# Altium footprint library MyComponents_v2.5.PcbLib: 403 footprints (part 3 of 26)
Each footprint in its own frame and in the unit in brackets; x right, y up, seen from the top. Pads: shape width x height; smd on the part's side, far side on the other; paste and mask are expansions set on the pad; w line width, h text height; cw(c..) or ccw(c..) is an arc to the next point about the centre after c.
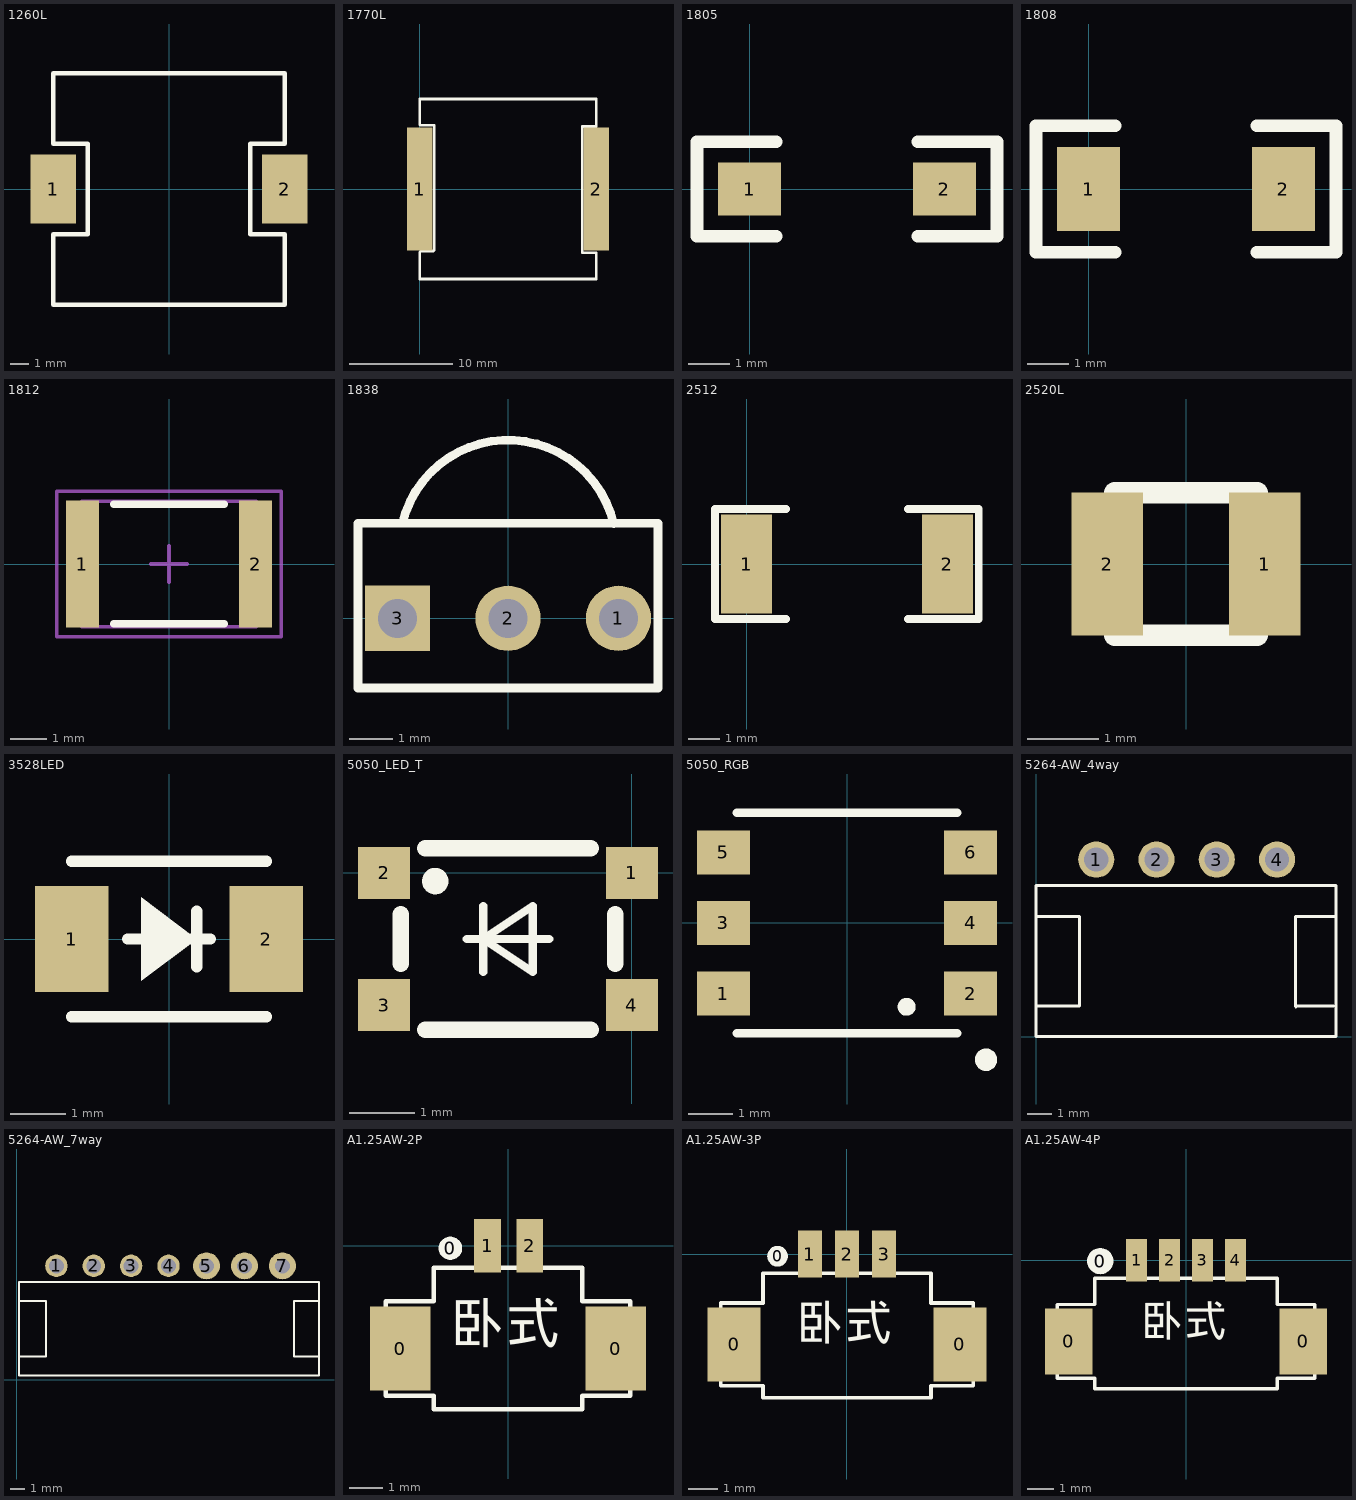
[diagram p2: the footprints below, top view; thin cyan lines are the x and y axes]

## 1260L [mm] "一体成型贴片电感"
height 6
pads (2):
  rect 2.5x3.8 smd: 1(-6.4,0) 2(6.4,0)
Top Overlay:
  lines w0.254: -6.4,-6.4 6.4,-6.4 6.4,-2.5 4.5,-2.5 4.5,2.5 6.4,2.5 6.4,6.4 -6.4,6.4 -6.4,2.5 -4.5,2.5 -4.5,-2.5 -6.4,-2.5 -6.4,-6.4

## 1770L [mm] "贴片一体成型功率电感 17.5mm*17.15mm*7mm"
height 7
pads (2):
  rect 2.5x12 smd: 1(0,0) 2(17.15,0)
Top Overlay:
  lines w0.254: 0,-8.75 17.15,-8.75 17.15,-6.218 17.13,-6.198 15.773,-6.198 15.773,6.071 17.15,6.071 17.15,8.75 0,8.75 0,6.248 0.051,6.198 1.422,6.198 1.397,6.172 1.397,-5.944 1.321,-6.02 0.127,-6.02 0,-6.147 0,-8.75

## 1805 [mil]
pads (2):
  rect 60x50 smd: 1(0,0) 2(185,0)
Top Overlay:
  lines w12: 25,-45 -50,-45 -50,45 25,45 ; 160,-45 235,-45 235,45 160,45

## 1808 [mil]
pads (2):
  rect 60x80 smd: 1(0,0) 2(185,0)
Top Overlay:
  lines w12: 25,-60 -50,-60 -50,60 25,60 ; 160,-60 235,-60 235,60 160,60

## 1812 [mm]
height 1.25
pads (2):
  rect 0.9x3.45 smd: 1(-2.35,0) 2(2.35,0)
Top Overlay:
  lines w0.2: -1.5,-1.625 1.5,-1.625 ; -1.5,1.625 1.5,1.625
Mechanical 13:
  lines w0.1: -2.365,-1.705 -2.365,1.705 2.365,1.705 2.365,-1.705 -2.365,-1.705
Mechanical 15:
  lines w0.1: -0.5,0 0.5,0 ; 0,-0.5 0,0.5 ; -3.05,-1.975 -3.05,1.975 3.05,1.975 3.05,-1.975 -3.05,-1.975
3D body: height 1.25, standoff 0, extent -2.365,-1.705 2.365,1.705

## 1838 [mm] "红外接收管"
pads (3):
  round 1.5 hole 0.9: 1(2.54,0) 2(0,0)
  rect 1.5x1.5 hole 0.9: 3(-2.54,0)
Top Overlay:
  lines w0.2: -2.428,2.197 cw(c0,1.6) 2.433,2.174 ; -3.45,-1.6 -3.45,2.19 3.45,2.19 3.45,-1.6 -3.45,-1.6

## 2512 [mm] "采样电阻"
height 0.65
pads (2):
  rect 1.65x3.2 smd: 1(0,0) 2(6.48,0)
Top Overlay:
  lines w0.254: 1.27,-1.778 -1.016,-1.778 -1.016,1.778 1.27,1.778 ; 5.207,-1.778 7.493,-1.778 7.493,1.778 5.207,1.778
3D body "2512.step": height 1.6, standoff 0, extent 0.076,-1.5 6.426,1.5

## 2520L [mm]
pads (2):
  rect 1x2 smd: 1(1.1,0) 2(-1.1,0)
Top Overlay:
  lines w0.3: -1,-1 1,-1 ; -1,1 1,1
3D body "2520L.step": height 1.8, standoff 0, extent -1.25,-1 1.25,1

## 3528LED [mm]
pads (2):
  rect 1.33x1.9 smd: 1(-1.75,0) 2(1.75,0)
Top Overlay:
  region: -0.5,0.75 -0.5,-0.75 0.5,0
  lines w0.2: -1.756,-1.4 1.756,-1.4 ; -1.756,1.4 1.756,1.4 ; -0.75,0 0.75,0 ; 0.5,-0.5 0.5,0.5
3D body "LED 2835.step": height 0.72, standoff 0, extent -1.756,-1.4 1.756,1.4

## 5050_LED_T [mm]
pads (4):
  rect 0.8x0.8 smd: 1(0,0) 2(-3.81,0) 3(-3.81,-2.032) 4(0,-2.032)
Top Overlay:
  circle w0.203: c-3.023,-0.127 r0.102
  lines w0.127: -2.54,-1.016 -1.27,-1.016 ; -2.286,-1.524 -2.286,-0.508 ; -2.286,-1.016 -1.524,-0.508 -1.524,-1.524 -2.286,-1.016
  lines w0.254: -3.556,-1.397 -3.556,-0.635 ; -3.175,-2.413 -0.635,-2.413 ; -3.175,0.381 -0.635,0.381 ; -0.254,-1.397 -0.254,-0.635

## 5050_RGB [mm] "RGB"
pads (6):
  rect 1.2x1 smd: 1(-2.8,-1.6) 2(2.8,-1.6) 3(-2.8,0) 4(2.8,0) 5(-2.8,1.6) 6(2.8,1.6)
Top Overlay:
  circle w0.254: c3.151,-3.1 r0.127
  circle w0.203: c1.351,-1.9 r0.102
  lines w0.2: -2.5,-2.5 2.5,-2.5 ; -2.5,2.5 2.5,2.5
3D body "5050RGB.step": height 1.4, standoff -0.15, extent -2.75,-2.5 2.75,2.5

## 5264-AW_4way [mm] "额定电压250V,额定电流2A,孔径0.7mm，接触电阻0.02R,适用印制板厚度1.6mm"
height 4.9
pads (4):
  round 1.5 hole 1: 1(2.5,7.341) 2(5,7.341) 3(7.5,7.341) 4(10,7.341)
Top Overlay:
  lines w0.127: 0,4.978 1.803,4.978 1.803,1.27 0.025,1.27 ; 10.795,1.27 12.344,1.27 ; 10.795,4.953 10.77,4.978 ; 12.395,4.978 10.973,4.978 10.77,4.978 ; 10.77,1.245 10.795,1.219 10.77,1.245 ; 10.77,1.245 10.77,4.978 ; 0,0 0,6.274 12.446,6.274 12.446,0 0,0

## 5264-AW_7way [mm] "额定电压250V,额定电流2A,孔径0.7mm，接触电阻0.02R,适用印制板厚度1.6mm"
height 4.9
pads (7):
  round 1.5 hole 1: 1(2.66,7.62) 2(5.16,7.62) 3(7.66,7.62) 4(10.16,7.62)
  round 1.8 hole 1: 5(12.7,7.62) 6(15.24,7.62) 7(17.78,7.62)
Top Overlay:
  lines w0.127: 0.16,5.258 1.963,5.258 1.963,1.549 0.185,1.549 ; 18.575,5.232 18.55,5.258 ; 20.124,1.549 18.575,1.549 18.55,1.575 18.55,5.258 ; 20.175,5.258 18.753,5.258 18.55,5.258 ; 0.16,0.279 20.226,0.279 20.226,6.553 0.16,6.553 0.16,0.279

## A1.25AW-2P [mm] "1.25mm卧贴 立式"
pads (5):
  rect 1.8x2.5 smd: 0(-3.2,-3.05) 0(3.2,-3.05)
  round 0.7 on Top Overlay: 0(-1.71,-0.075)
  rect 0.8x1.6 smd: 1(-0.605,0) 2(0.645,0)
Top Overlay:
  lines w0.127: -3.625,-4.45 -3.625,-1.65 -2.2,-1.65 -2.2,-0.65 0,-0.65 2.2,-0.65 2.2,-1.65 3.625,-1.65 3.625,-4.45 2.2,-4.45 2.2,-4.85 0,-4.85 -2.2,-4.85 -2.2,-4.45 -3.625,-4.45
  text "卧式" at -1.7,-3.275 h2.03
3D body "MX1.25AW-2P.stp": height 3.4, standoff -0.01, extent -3.575,-4.85 3.675,0.56

## A1.25AW-3P [mm] "1.25mm卧贴"
pads (6):
  rect 1.8x2.5 smd: 0(-3.805,-3.05) 0(3.825,-3.05)
  round 0.7 on Top Overlay: 0(-2.335,-0.075)
  rect 0.8x1.6 smd: 1(-1.24,0) 2(0.01,0) 3(1.26,0)
Top Overlay:
  lines w0.127: 0,-4.85 -2.825,-4.85 -2.825,-4.45 -4.25,-4.45 -4.25,-1.65 -2.825,-1.65 -2.825,-0.65 0,-0.65 ; 0.02,-4.85 2.845,-4.85 2.845,-4.45 4.27,-4.45 4.27,-1.65 2.845,-1.65 2.845,-0.65 0.02,-0.65
  text "卧式" at -1.69,-3.275 h2.03
3D body "MX1.25AW-3P.stp": height 3.4, standoff -0.01, extent -4.2,-4.8 4.3,0.61

## A1.25AW-4P [mm]
pads (7):
  rect 1.8x2.5 smd: 0(-4.44,-3.075) 0(4.44,-3.075)
  round 1 on Top Overlay: 0(-3.253,-0.03)
  rect 0.8x1.6 smd: 1(-1.875,0) 2(-0.625,0) 3(0.625,0) 4(1.875,0)
Top Overlay:
  lines w0.127: -0.025,-4.875 -3.46,-4.875 -3.46,-4.475 -4.885,-4.475 -4.885,-1.675 -3.46,-1.675 -3.46,-0.675 0,-0.675 3.46,-0.675 3.46,-1.675 4.885,-1.675 4.885,-4.475 3.46,-4.475 3.46,-4.875 0.025,-4.875
  text "卧式" at -1.7,-3.275 h2.03
3D body "MX1.25AW-4P.stp": height 3.4, standoff -0.01, extent -4.85,-4.825 4.9,0.585